# Altium footprint library VC_PCBLib.PcbLib: 63 footprints (part 4 of 4)
Each footprint in its own frame and in the unit in brackets; x right, y up, seen from the top. Pads: shape width x height; smd on the part's side, far side on the other; paste and mask are expansions set on the pad; w line width, h text height; cw(c..) or ccw(c..) is an arc to the next point about the centre after c.
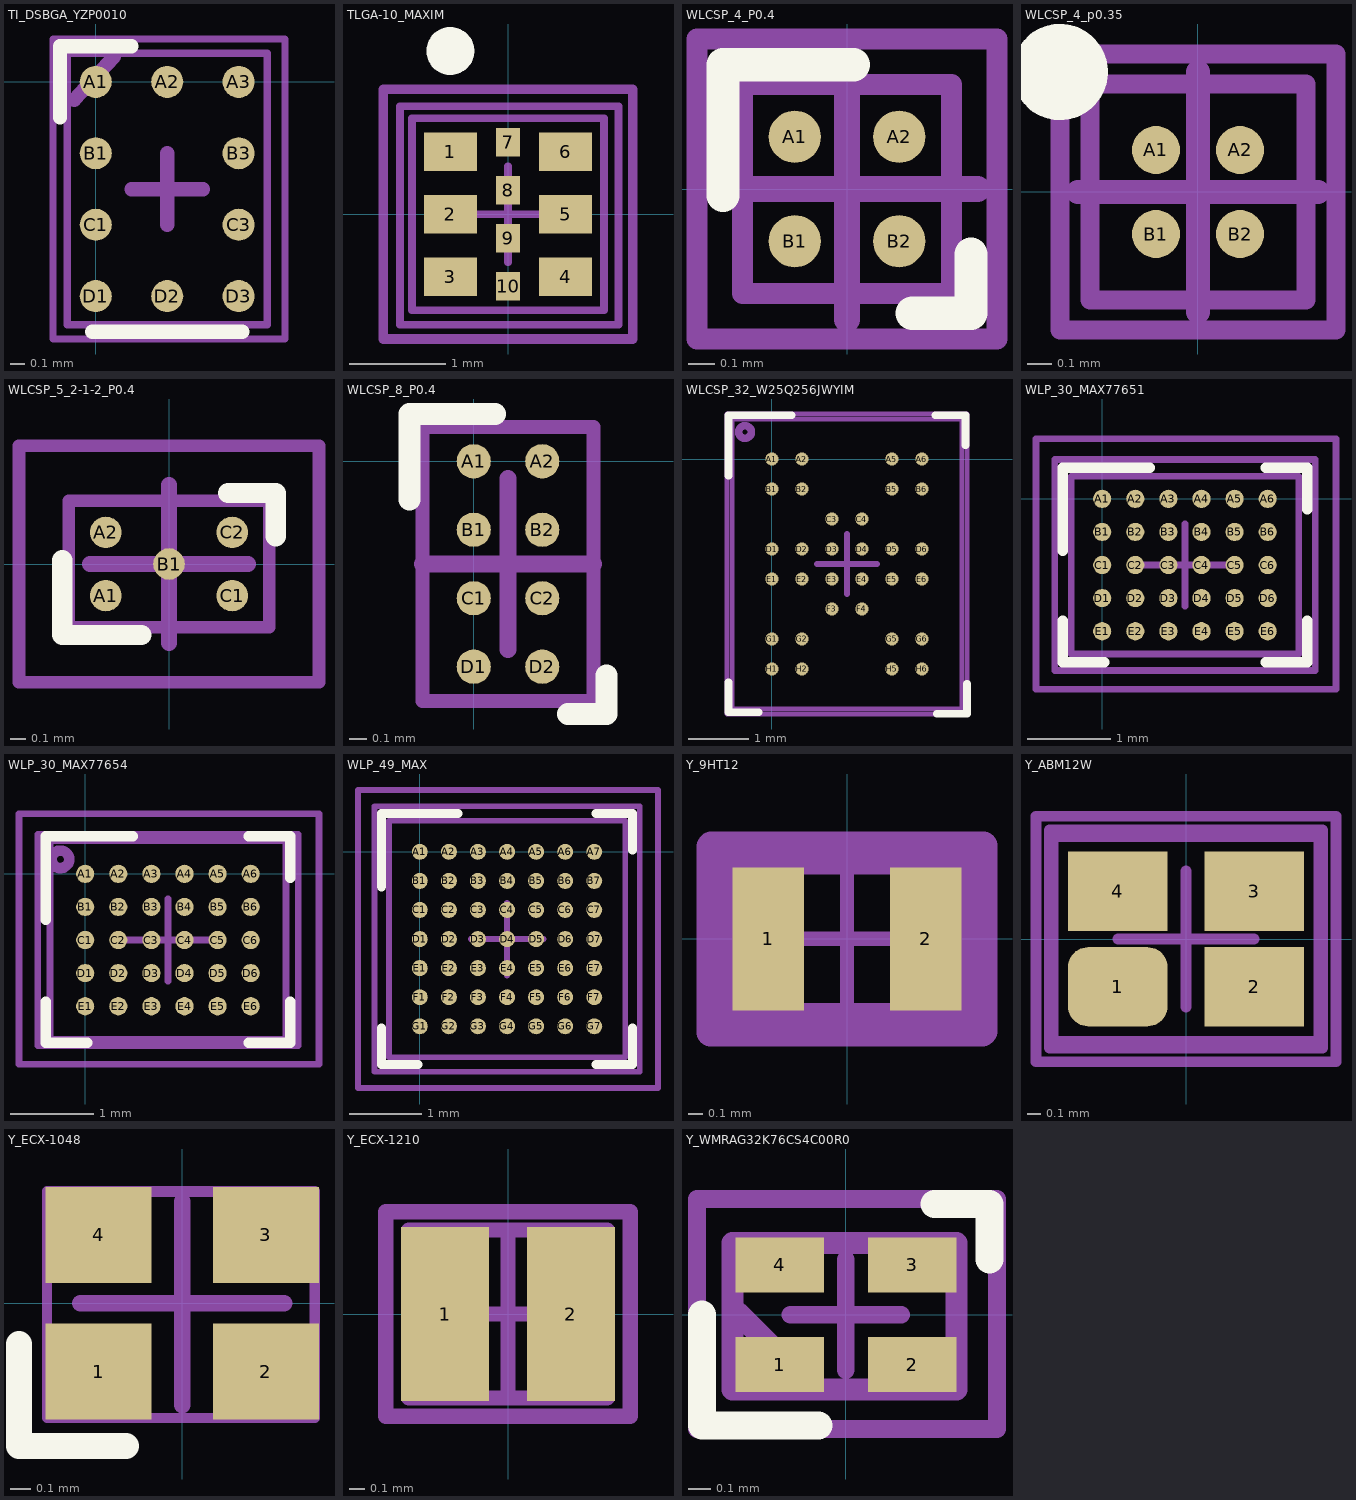
[diagram p3: the footprints below, top view; thin cyan lines are the x and y axes]

## TI_DSBGA_YZP0010 [mm]
pads (10):
  round 0.225 smd mask+0: A1(0,0) A2(0.5,0) A3(1,0) B1(0,-0.5) B3(1,-0.5) C1(0,-1) C3(1,-1) D1(0,-1.5) D2(0.5,-1.5) D3(1,-1.5)
Top Overlay:
  lines w0.1: -0.25,-0.25 -0.25,0.25 0.25,0.25 ; -0.025,-1.75 1.025,-1.75
Top Assembly:
  lines w0.05: -0.2,-1.7 1.2,-1.7 1.2,0.2 -0.2,0.2 -0.2,-1.7
  lines w0.1: -0.15,-0.125 0.125,0.175
Top Component Outline:
  lines w0.05: -0.2,-1.7 1.2,-1.7 1.2,0.2 -0.2,0.2 -0.2,-1.7
Top Courtyard:
  lines w0.05: -0.3,-1.8 1.325,-1.8 1.325,0.3 -0.3,0.3 -0.3,-1.8
Top Component Center:
  lines w0.1: 0.25,-0.752 0.75,-0.752 ; 0.5,-1 0.5,-0.5
3D body: height 0.5, standoff 0.19, extent -0.2,-1.7 1.2,0.2
3D body: height 0.25, standoff 0, extent 0.875,-0.625 1.125,-0.375
3D body: height 0.25, standoff 0, extent 0.875,-1.125 1.125,-0.875
3D body: height 0.25, standoff 0, extent 0.875,-1.625 1.125,-1.375
3D body: height 0.25, standoff 0, extent 0.375,-1.625 0.625,-1.375
3D body: height 0.25, standoff 0, extent -0.125,-1.625 0.125,-1.375
3D body: height 0.25, standoff 0, extent -0.125,-1.125 0.125,-0.875
3D body: height 0.25, standoff 0, extent -0.125,-0.625 0.125,-0.375
3D body: height 0.25, standoff 0, extent 0.875,-0.125 1.125,0.125
3D body: height 0.25, standoff 0, extent 0.375,-0.125 0.625,0.125
3D body: height 0.25, standoff 0, extent -0.125,-0.125 0.125,0.125

## TLGA-10_MAXIM [mm]
pads (10):
  rect 0.55x0.4 smd paste-0.05: 1(-0.6,0.65) 2(-0.6,0) 3(-0.6,-0.65) 4(0.6,-0.65) 5(0.6,0) 6(0.6,0.65)
  rect 0.25x0.3 smd paste-0.05: 7(0,0.75) 8(0,0.25) 9(0,-0.25) 10(0,-0.75)
Top Overlay:
  circle w0.25: c-0.6,1.7 r0.125
Top Assembly:
  lines w0.1: -1.3,-1.3 -1.3,1.3 1.3,1.3 1.3,-1.3 -1.3,-1.3
Top Component Outline:
  lines w0.08: -1,-1 1,-1 1,1 -1,1 -1,-1
Top Courtyard:
  lines w0.08: -1.125,-1.15 -1.125,1.125 1.15,1.125 1.15,-1.15 -1.125,-1.15
Top Component Center:
  lines w0.08: -0.5,0 0.5,0 ; 0,-0.5 0,0.5
3D body "21-100265.STEP": height 0.77, standoff 0.01, extent -1,-1 1,1

## WLCSP_4_P0.4 [mm]
pads (4):
  round 0.2 smd paste+0 mask+0: A1(-0.2,0.2) A2(0.2,0.2) B1(-0.2,-0.2) B2(0.2,-0.2)
Top Overlay:
  lines w0.127: -0.475,-0.025 -0.475,0.476 0.025,0.476 ; 0.25,-0.476 0.475,-0.476 0.475,-0.25
Top Assembly:
  lines w0.08: -0.575,-0.575 0.575,-0.575 0.575,0.575 -0.575,0.575 -0.575,-0.575
Top Component Outline:
  lines w0.08: -0.4,-0.4 -0.4,0.4 0.4,0.4 0.4,-0.4 -0.4,-0.4
Top Courtyard:
  lines w0.08: -0.575,-0.575 0.575,-0.575 0.575,0.575 -0.575,0.575 -0.575,-0.575
Top Component Center:
  lines w0.1: -0.5,0 0.5,0 ; 0,-0.5 0,0.5
3D body: height 0.23, standoff -0.03, extent -0.33,-0.33 -0.07,-0.07
3D body: height 0.23, standoff -0.03, extent 0.07,-0.33 0.33,-0.07
3D body: height 0.41, standoff 0.06, extent -0.4,-0.4 0.4,0.4
3D body: height 0.23, standoff -0.03, extent -0.33,0.07 -0.07,0.33
3D body: height 0.23, standoff -0.03, extent 0.07,0.07 0.33,0.33

## WLCSP_4_p0.35 [mm]
pads (4):
  round 0.2 smd mask+0: A1(-0.175,0.175) A2(0.175,0.175) B1(-0.175,-0.175) B2(0.175,-0.175)
Top Overlay:
  circle w0.2: c-0.575,0.5 r0.1
Top Assembly:
  lines w0.08: -0.575,-0.575 0.575,-0.575 0.575,0.575 -0.575,0.575 -0.575,-0.575
Top Component Outline:
  lines w0.08: -0.45,-0.45 -0.45,0.45 0.45,0.45 0.45,-0.45 -0.45,-0.45
Top Courtyard:
  lines w0.08: -0.575,-0.575 0.575,-0.575 0.575,0.575 -0.575,0.575 -0.575,-0.575
Top Component Center:
  lines w0.1: -0.5,0 0.5,0 ; 0,-0.5 0,0.5
3D body "wclsp_0.35_4.STEP": height 0.41, standoff -0.02, extent -0.32,-0.315 0.32,0.325

## WLCSP_5_2-1-2_P0.4 [mm]
pads (5):
  round 0.2 smd paste+0 mask+0: A1(-0.4,-0.2) A2(-0.4,0.2) B1(0,0) C1(0.4,-0.2) C2(0.4,0.2)
Top Overlay:
  lines w0.127: -0.676,0.025 -0.676,-0.45 -0.175,-0.45 ; 0.375,0.45 0.676,0.45 0.676,0.175
Top Assembly:
  lines w0.08: -0.95,-0.75 -0.95,0.75 0.95,0.75 0.95,-0.75 -0.95,-0.75
Top Component Outline:
  lines w0.08: -0.634,-0.4 0.634,-0.4 0.634,0.4 -0.634,0.4 -0.634,-0.4
Top Courtyard:
  lines w0.08: -0.95,-0.75 -0.95,0.75 0.95,0.75 0.95,-0.75 -0.95,-0.75
Top Component Center:
  lines w0.1: -0.5,0 0.5,0 ; 0,-0.5 0,0.5
3D body: height 0.23, standoff -0.03, extent 0.27,-0.33 0.53,-0.07
3D body: height 0.23, standoff -0.03, extent 0.27,0.07 0.53,0.33
3D body: height 0.23, standoff -0.03, extent -0.128,-0.131 0.132,0.129
3D body: height 0.23, standoff -0.03, extent -0.53,-0.33 -0.27,-0.07
3D body: height 0.23, standoff -0.03, extent -0.53,0.07 -0.27,0.33
3D body: height 0.57, standoff 0.2, extent -0.6,-0.375 0.6,0.375

## WLCSP_8_P0.4 [mm]
pads (8):
  round 0.2 smd mask+0: A1(0,0) A2(0.4,0) B1(0,-0.4) B2(0.4,-0.4) C1(0,-0.8) C2(0.4,-0.8) D1(0,-1.2) D2(0.4,-1.2)
Top Overlay:
  lines w0.127: -0.375,-0.225 -0.375,0.276 0.125,0.276 ; 0.55,-1.476 0.775,-1.476 0.775,-1.25
Top Assembly:
  lines w0.08: -0.3,-1.4 -0.3,0.2 0.7,0.2 0.7,-1.4 -0.3,-1.4
Top Component Outline:
  lines w0.08: -0.3,-1.4 -0.3,0.2 0.7,0.2 0.7,-1.4 -0.3,-1.4
Top Component Center:
  lines w0.1: -0.3,-0.6 0.7,-0.6 ; 0.2,-1.1 0.2,-0.1
3D body: height 0.23, standoff -0.03, extent 0.27,-1.33 0.53,-1.07
3D body: height 0.23, standoff -0.03, extent -0.13,-1.33 0.13,-1.07
3D body: height 0.23, standoff -0.03, extent 0.27,-0.13 0.53,0.13
3D body: height 0.23, standoff -0.03, extent -0.13,-0.13 0.13,0.13
3D body: height 0.41, standoff 0.06, extent -0.3,-1.4 0.7,0.2
3D body: height 0.23, standoff -0.03, extent 0.27,-0.53 0.53,-0.27
3D body: height 0.23, standoff -0.03, extent -0.13,-0.53 0.13,-0.27
3D body: height 0.23, standoff -0.03, extent -0.13,-0.93 0.13,-0.67
3D body: height 0.23, standoff -0.03, extent 0.27,-0.93 0.53,-0.67

## WLCSP_32_W25Q256JWYIM [mm]
pads (32):
  round 0.22 smd mask+0: A1(0,0) A2(0.5,0) A5(2,0) A6(2.5,0) B1(0,-0.5) B2(0.5,-0.5) B5(2,-0.5) B6(2.5,-0.5) C3(1,-1) C4(1.5,-1) D1(0,-1.5) D2(0.5,-1.5) D3(1,-1.5) D4(1.5,-1.5) D5(2,-1.5) D6(2.5,-1.5) E1(0,-2) E2(0.5,-2) E3(1,-2) E4(1.5,-2) E5(2,-2) E6(2.5,-2) F3(1,-2.5) F4(1.5,-2.5) G1(0,-3) G2(0.5,-3) G5(2,-3) G6(2.5,-3) H1(0,-3.5) H2(0.5,-3.5) H5(2,-3.5) H6(2.5,-3.5)
Top Overlay:
  lines w0.127: -0.725,-0.278 -0.725,0.726 0.325,0.726 ; -0.724,-3.718 -0.724,-4.218 -0.224,-4.218 ; 2.725,0.726 3.225,0.726 3.225,0.226 ; 2.751,-4.243 3.251,-4.243 3.251,-3.743
Top Assembly:
  lines w0.08: -0.663,-4.163 -0.663,0.663 3.162,0.663 3.162,-4.163 -0.663,-4.163
Top Component Outline:
  circle w0.127: c-0.45,0.45 r0.106
  lines w0.08: -0.75,-4.25 -0.75,0.75 3.25,0.75 3.25,-4.25 -0.75,-4.25
Top Courtyard:
  lines w0.08: -0.75,-4.25 3.25,-4.25 3.25,0.75 -0.75,0.75 -0.75,-4.25
Top Component Center:
  lines w0.1: 0.75,-1.75 1.75,-1.75 ; 1.25,-2.25 1.25,-1.25
3D body: height 0.3, standoff 0, extent -0.15,-2.15 0.15,-1.85
3D body: height 0.3, standoff 0, extent 0.35,-2.15 0.65,-1.85
3D body: height 0.3, standoff 0, extent 0.35,-1.65 0.65,-1.35
3D body: height 0.3, standoff 0, extent -0.15,-1.65 0.15,-1.35
3D body: height 0.3, standoff 0, extent -0.15,-3.625 0.15,-3.325
3D body: height 0.3, standoff 0, extent 0.35,-3.625 0.65,-3.325
3D body: height 0.3, standoff 0, extent 0.35,-3.125 0.65,-2.825
3D body: height 0.3, standoff 0, extent -0.15,-3.125 0.15,-2.825
3D body: height 0.3, standoff 0, extent 1.85,-3.65 2.15,-3.35
3D body: height 0.3, standoff 0, extent 2.35,-3.65 2.65,-3.35
3D body: height 0.3, standoff 0, extent 2.35,-3.15 2.65,-2.85
3D body: height 0.3, standoff 0, extent 1.85,-3.15 2.15,-2.85
3D body: height 0.3, standoff 0, extent 1.85,-2.15 2.15,-1.85
3D body: height 0.3, standoff 0, extent 2.35,-2.15 2.65,-1.85
3D body: height 0.3, standoff 0, extent 2.35,-1.65 2.65,-1.35
3D body: height 0.3, standoff 0, extent 1.85,-1.65 2.15,-1.35
3D body: height 0.3, standoff 0, extent 0.85,-2.65 1.15,-2.35
3D body: height 0.3, standoff 0, extent 1.35,-2.65 1.65,-2.35
3D body: height 0.3, standoff 0, extent 1.35,-2.15 1.65,-1.85
3D body: height 0.3, standoff 0, extent 0.85,-2.15 1.15,-1.85
3D body: height 0.3, standoff 0, extent 0.85,-1.65 1.15,-1.35
3D body: height 0.3, standoff 0, extent 1.35,-1.65 1.65,-1.35
3D body: height 0.3, standoff 0, extent 1.35,-1.15 1.65,-0.85
3D body: height 0.3, standoff 0, extent 0.85,-1.15 1.15,-0.85
3D body: height 0.3, standoff 0, extent 1.85,-0.65 2.15,-0.35
3D body: height 0.3, standoff 0, extent 2.35,-0.65 2.65,-0.35
3D body: height 0.3, standoff 0, extent 2.35,-0.15 2.65,0.15
3D body: height 0.3, standoff 0, extent 1.85,-0.15 2.15,0.15
3D body: height 0.3, standoff 0, extent -0.15,-0.65 0.15,-0.35
3D body: height 0.3, standoff 0, extent 0.35,-0.65 0.65,-0.35
3D body: height 0.3, standoff 0, extent 0.35,-0.15 0.65,0.15
3D body: height 0.3, standoff 0, extent -0.15,-0.15 0.15,0.15
3D body: height 0.54, standoff 0.18, extent -0.663,-4.163 3.163,0.663

## WLP_30_MAX77651 [mm]
pads (30):
  round 0.22 smd paste+0 mask+0: A1(0,0) A2(0.4,0) A3(0.8,0) A4(1.2,0) A5(1.6,0) A6(2,0) B1(0,-0.4) B2(0.4,-0.4) B3(0.8,-0.4) B4(1.2,-0.4) B5(1.6,-0.4) B6(2,-0.4) C1(0,-0.8) C2(0.4,-0.8) C3(0.8,-0.8) C4(1.2,-0.8) C5(1.6,-0.8) C6(2,-0.8) D1(0,-1.2) D2(0.4,-1.2) D3(0.8,-1.2) D4(1.2,-1.2) D5(1.6,-1.2) D6(2,-1.2) E1(0,-1.6) E2(0.4,-1.6) E3(0.8,-1.6) E4(1.2,-1.6) E5(1.6,-1.6) E6(2,-1.6)
Top Overlay:
  lines w0.127: -0.475,-1.475 -0.475,-1.975 0.025,-1.975 ; -0.475,-0.629 -0.475,0.375 0.575,0.375 ; 1.975,-1.975 2.475,-1.975 2.475,-1.475 ; 1.975,0.375 2.475,0.375 2.475,-0.125
Top Assembly:
  lines w0.08: -0.575,-2.075 2.575,-2.075 2.575,0.475 -0.575,0.475 -0.575,-2.075
Top Component Outline:
  lines w0.08: -0.375,-1.875 2.375,-1.875 2.375,0.275 -0.375,0.275 -0.375,-1.875
Top Courtyard:
  lines w0.08: -0.8,-2.3 2.825,-2.3 2.825,0.725 -0.8,0.725 -0.8,-2.3
Top Component Center:
  lines w0.08: 0.5,-0.8 1.5,-0.8 ; 1,-1.3 1,-0.3
3D body "21-100047A_W302H2+1_MXM.step": height 0.69, standoff 0, extent -0.372,-1.88 2.372,0.28

## WLP_30_MAX77654 [mm]
pads (30):
  round 0.22 smd paste+0 mask+0: A1(0,0) A2(0.4,0) A3(0.8,0) A4(1.2,0) A5(1.6,0) A6(2,0) B1(0,-0.4) B2(0.4,-0.4) B3(0.8,-0.4) B4(1.2,-0.4) B5(1.6,-0.4) B6(2,-0.4) C1(0,-0.8) C2(0.4,-0.8) C3(0.8,-0.8) C4(1.2,-0.8) C5(1.6,-0.8) C6(2,-0.8) D1(0,-1.2) D2(0.4,-1.2) D3(0.8,-1.2) D4(1.2,-1.2) D5(1.6,-1.2) D6(2,-1.2) E1(0,-1.6) E2(0.4,-1.6) E3(0.8,-1.6) E4(1.2,-1.6) E5(1.6,-1.6) E6(2,-1.6)
Top Overlay:
  lines w0.127: -0.475,-0.553 -0.475,0.451 0.575,0.451 ; -0.474,-1.543 -0.474,-2.043 0.026,-2.043 ; 1.975,0.451 2.475,0.451 2.475,-0.049 ; 1.976,-2.043 2.476,-2.043 2.476,-1.543
Top Assembly:
  circle w0.127: c-0.3,0.175 r0.106
  lines w0.08: -0.575,-2.075 2.575,-2.075 2.575,0.475 -0.575,0.475 -0.575,-2.075
Top Component Outline:
  lines w0.08: -0.426,-1.997 2.426,-1.997 ; -0.426,-1.997 -0.426,0.402 2.426,0.402 2.426,-1.997
Top Courtyard:
  lines w0.08: -0.8,-2.3 2.825,-2.3 2.825,0.725 -0.8,0.725 -0.8,-2.3
Top Component Center:
  lines w0.08: 0.5,-0.8 1.5,-0.8 ; 1,-1.3 1,-0.3
3D body "21-100307_N302C21_MXM.step": height 0.51, standoff 0, extent -0.397,-1.968 2.397,0.368

## WLP_49_MAX [mm]
pads (49):
  round 0.22 smd paste+0 mask+0: A1(0,0) A2(0.4,0) A3(0.8,0) A4(1.2,0) A5(1.6,0) A6(2,0) A7(2.4,0) B1(0,-0.4) B2(0.4,-0.4) B3(0.8,-0.4) B4(1.2,-0.4) B5(1.6,-0.4) B6(2,-0.4) B7(2.4,-0.4) C1(0,-0.8) C2(0.4,-0.8) C3(0.8,-0.8) C4(1.2,-0.8) C5(1.6,-0.8) C6(2,-0.8) C7(2.4,-0.8) D1(0,-1.2) D2(0.4,-1.2) D3(0.8,-1.2) D4(1.2,-1.2) D5(1.6,-1.2) D6(2,-1.2) D7(2.4,-1.2) E1(0,-1.6) E2(0.4,-1.6) E3(0.8,-1.6) E4(1.2,-1.6) E5(1.6,-1.6) E6(2,-1.6) E7(2.4,-1.6) F1(0,-2) F2(0.4,-2) F3(0.8,-2) F4(1.2,-2) F5(1.6,-2) F6(2,-2) F7(2.4,-2) G1(0,-2.4) G2(0.4,-2.4) G3(0.8,-2.4) G4(1.2,-2.4) G5(1.6,-2.4) G6(2,-2.4) G7(2.4,-2.4)
Top Overlay:
  lines w0.127: -0.525,-2.425 -0.525,-2.925 -0.025,-2.925 ; -0.525,-0.479 -0.525,0.525 0.525,0.525 ; 2.425,-2.925 2.925,-2.925 2.925,-2.425 ; 2.425,0.525 2.925,0.525 2.925,0.025
Top Assembly:
  lines w0.08: -0.625,-3.025 -0.625,0.626 3.026,0.626 3.026,-3.025 -0.625,-3.025
Top Component Outline:
  lines w0.08: -0.425,-2.825 2.826,-2.825 2.826,0.426 -0.425,0.426 -0.425,-2.825
Top Courtyard:
  lines w0.08: -0.85,-3.25 3.276,-3.25 3.276,0.851 -0.85,0.851 -0.85,-3.25
Top Component Center:
  lines w0.08: 0.7,-1.2 1.7,-1.2 ; 1.2,-1.7 1.2,-0.7
3D body "21-0443_W493B3+2_MXM.step": height 0.69, standoff 0, extent -0.426,-2.826 2.826,0.426

## Y_9HT12 [mm]
pads (2):
  rect 0.5x1 smd paste+0 mask+0: 1(-0.55,0) 2(0.55,0)
Top Assembly:
  lines w0.2: -0.954,-0.654 0.946,-0.654 0.946,0.646 -0.954,0.646 -0.954,-0.654
Top Component Outline:
  lines w0.2: -0.946,-0.648 -0.946,0.652 0.954,0.652 0.954,-0.648 -0.946,-0.648
Top 3D Body:
  lines w0.2: -0.85,-0.55 0.85,-0.55 0.85,0.55 -0.85,0.55 -0.85,-0.55
Top Courtyard:
  lines w0.2: -0.95,-0.65 -0.95,0.65 ; -0.95,-0.65 0.95,-0.65 ; -0.95,-0.65 0.95,-0.65 ; -0.95,-0.65 -0.95,0.65 ; -0.95,0.65 0.95,0.65 ; -0.95,0.65 0.95,0.65 ; 0.95,-0.65 0.95,0.65 ; 0.95,-0.65 0.95,0.65
Top Component Center:
  lines w0.1: -0.5,0 0.5,0 ; 0,-0.5 0,0.5
3D body "Crys_TXC_9HT12-32_768KAZC-T_eec.STEP": height 0.25, standoff 0, extent -0.95,-0.65 0.95,0.65

## Y_ABM12W [mm]
pads (4):
  rrect50% 0.73x0.58 smd paste+0 mask+0: 1(-0.5,-0.35)
  rect 0.73x0.58 smd paste+0 mask+0: 2(0.5,-0.35) 3(0.5,0.35) 4(-0.5,0.35)
Top Assembly:
  lines w0.08: -1,-0.8 1,-0.8 1,0.8 -1,0.8 -1,-0.8
Top Component Outline:
  lines w0.08: -0.975,-0.75 -0.975,0.75 0.975,0.75 0.975,-0.75 -0.975,-0.75
Top Courtyard:
  lines w0.08: -1.1,-0.9 1.1,-0.9 1.1,0.9 -1.1,0.9 -1.1,-0.9
Top Component Center:
  lines w0.08: -0.5,0 0.5,0 ; 0,-0.5 0,0.5
3D body "Crys_Abracon_ABM12W-28_2240MHZ-4-D1X-T3_eec.STEP": height 0.41, standoff 0, extent -0.8,-0.6 0.8,0.6

## Y_ECX-1048 [mm]
pads (4):
  rect 0.52x0.47 smd: 1(-0.41,-0.335) 2(0.41,-0.335) 3(0.41,0.335) 4(-0.41,0.335)
Top Overlay:
  lines w0.127: -0.8,-0.2 -0.8,-0.7 -0.275,-0.7
Top Component Outline:
  lines w0.05: -0.663,-0.563 0.649,-0.563 0.649,0.545 -0.663,0.545 -0.663,-0.563
Top Courtyard:
  lines w0.05: -0.663,-0.563 0.65,-0.563 0.65,0.55 -0.663,0.55 -0.663,-0.563
Top Component Center:
  lines w0.08: -0.5,0 0.5,0 ; 0,-0.5 0,0.5
3D body "Y_ECX-1048.STEP": height 0.3, standoff -0.02, extent -0.6,-0.5 0.6,0.5

## Y_ECX-1210 [mm]
pads (2):
  rect 0.575x1.14 smd paste+0 mask+0: 1(-0.413,0) 2(0.413,0)
Top Assembly:
  lines w0.1: -0.8,-0.67 0.8,-0.67 0.8,0.67 -0.8,0.67 -0.8,-0.67
Top Component Outline:
  lines w0.1: -0.65,-0.55 -0.65,0.55 0.65,0.55 0.65,-0.55 -0.65,-0.55
Top Courtyard:
  lines w0.1: -0.8,-0.67 0.8,-0.67 0.8,0.67 -0.8,0.67 -0.8,-0.67
Top Component Center:
  lines w0.1: -0.5,0 0.5,0 ; 0,-0.5 0,0.5
3D body "Crys_ECS_International_ECS-_327-12_5-1210-TR_eec.STEP": height 0.25, standoff 0, extent -0.8,-0.67 0.8,0.67

## Y_WMRAG32K76CS4C00R0 [mm] "LGA"
pads (4):
  rect 0.4x0.25 smd: 1(-0.3,-0.225) 2(0.3,-0.225) 3(0.3,0.225) 4(-0.3,0.225)
Top Overlay:
  lines w0.127: -0.65,0 -0.65,-0.5 -0.125,-0.5 ; 0.4,0.5 0.65,0.5 0.65,0.25
Top Assembly:
  lines w0.08: -0.25,0 0.25,0 ; 0,-0.25 0,0.25
  lines w0.1: -0.49,0.01 -0.167,-0.313 ; -0.513,-0.338 -0.513,0.325 0.5,0.325 0.5,-0.338 -0.513,-0.338
Top Courtyard:
  lines w0.08: -0.673,-0.516 0.683,-0.516 0.683,0.523 -0.673,0.523 -0.673,-0.516
3D body "step_temp.STEP": height 0.35, standoff 0, extent -0.475,-0.3 0.475,0.3